# Altium footprint library Connector.PcbLib: 230 footprints (part 6 of 15)
Each footprint in its own frame and in the unit in brackets; x right, y up, seen from the top. Pads: shape width x height; smd on the part's side, far side on the other; paste and mask are expansions set on the pad; w line width, h text height; cw(c..) or ccw(c..) is an arc to the next point about the centre after c.
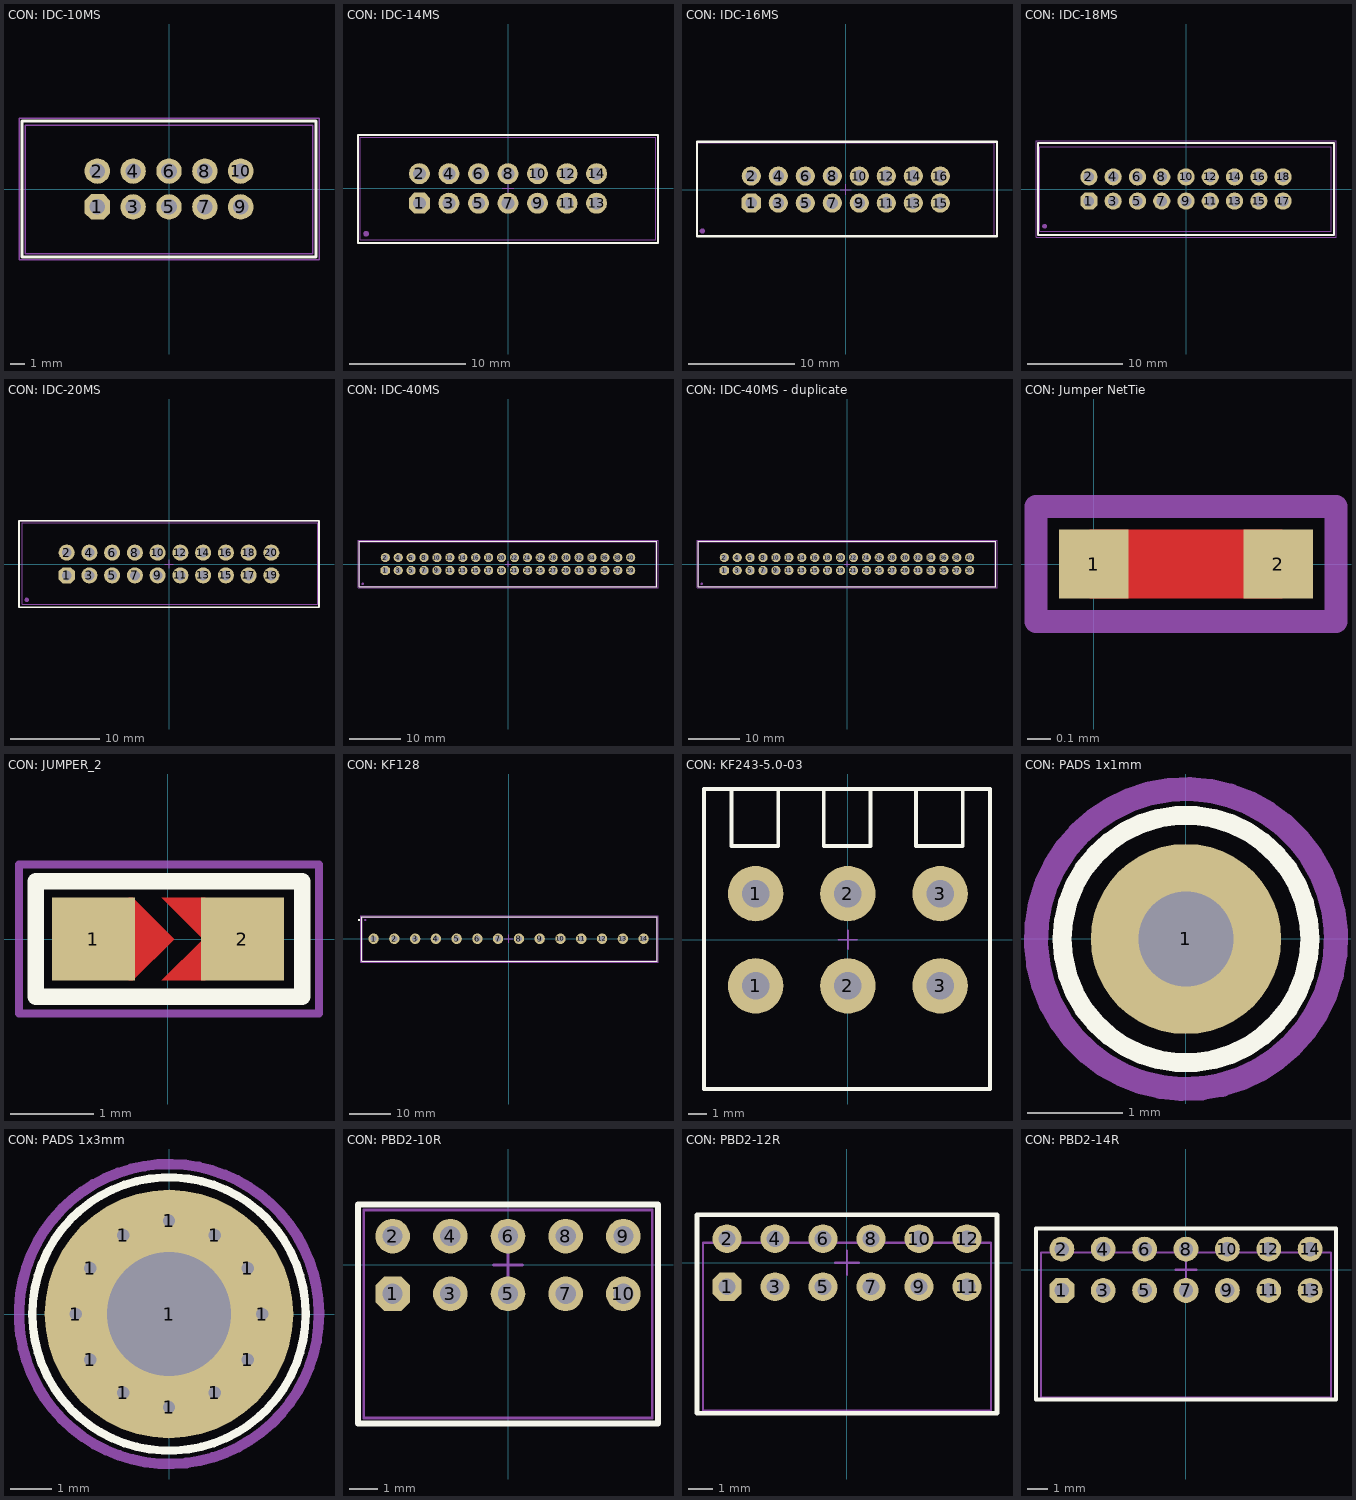
[diagram p5: the footprints below, top view; thin cyan lines are the x and y axes]

## CON: IDC-10MS [mm] "IDC-10MS 10 pin PCB-mount header"
height 10
pads (10):
  oct 1.8x1.8 hole 1.1: 1(-5.08,-1.27)
  round 1.8 hole 1.1: 2(-5.08,1.27) 3(-2.54,-1.27) 4(-2.54,1.27) 5(0,-1.27) 6(0,1.27) 7(2.54,-1.27) 8(2.54,1.27) 9(5.08,-1.27) 10(5.08,1.27)
Top Overlay:
  lines w0.2: -10.414,-4.826 -10.414,4.826 10.414,4.826 10.414,-4.826 -10.414,-4.826
TopAssy:
  lines w0.1: -10.2,-4.6 10.2,-4.6 10.2,4.5 -10.2,4.5 -10.2,-4.6
Border:
  lines w0.1: -10.625,-5.025 10.625,-5.025 10.625,5.025 -10.625,5.025 -10.625,-5.025
3D body "IDC-10MS.STEP": height 9, standoff -3.1, extent -10.14,-4.572 10.16,4.528

## CON: IDC-14MS [mm] "IDC-14MS connector"
height 9
pads (15):
  oct 1.8x1.8 hole 1.1: 1(-7.62,-1.27)
  round 1.8 hole 1.1: 2(-7.62,1.27) 3(-5.08,-1.27) 4(-5.08,1.27) 5(-2.54,-1.27) 6(-2.54,1.27) 7(0,-1.27) 8(0,1.27) 9(2.54,-1.27) 10(2.54,1.27) 11(5.08,-1.27) 12(5.08,1.27) 13(7.62,-1.27) 14(7.62,1.27)
  round 0.5 on Mech1: 38(-12.2,-3.9)
Top Overlay:
  lines w0.2: -12.9,-4.7 12.9,-4.7 12.9,4.6 -12.9,4.6 -12.9,-4.7
TopAssy:
  lines w0.1: -12.7,-4.4 -12.7,4.4 12.7,4.4 12.7,-4.4 -12.7,-4.4
Border:
  lines w0.1: -0.5,0 0.5,0 ; 0,-0.5 0,0.5 ; -12.9,-4.7 -12.9,4.6 12.9,4.6 12.9,-4.7 -12.9,-4.7
3D body "IDC-14MS.STEP": height 9.1, standoff -3, extent -12.24,-4.608 13.19,4.192

## CON: IDC-16MS [mm] "IDC-16MS straight leads pcb mount"
height 9
pads (17):
  oct 1.8x1.8 hole 1.1: 1(-8.89,-1.27)
  round 1.8 hole 1.1: 2(-8.89,1.27) 3(-6.35,-1.27) 4(-6.35,1.27) 5(-3.81,-1.27) 6(-3.81,1.27) 7(-1.27,-1.27) 8(-1.27,1.27) 9(1.27,-1.27) 10(1.27,1.27) 11(3.81,-1.27) 12(3.81,1.27) 13(6.35,-1.27) 14(6.35,1.27) 15(8.89,-1.27) 16(8.89,1.27)
  round 0.5 on Mech1: 39(-13.5,-3.9)
Top Overlay:
  lines w0.2: -14,-4.4 14.224,-4.4 14.224,4.5 -14,4.5 -14,-4.4
TopAssy:
  lines w0.1: -13.985,-4.4 -13.985,4.285 -13.985,4.4 13.985,4.4 13.985,-4.4 -13.985,-4.4
Border:
  lines w0.1: -0.5,0 0.5,0 ; 0,-0.5 0,0.5 ; -14,-4.4 -14,4.5 14.224,4.5 14.224,-4.4 -14,-4.4
3D body "IDC-16MS.STEP": height 9.1, standoff -3, extent -13.985,-4.4 13.985,4.4

## CON: IDC-18MS [mm]
height 10
pads (19):
  oct 1.8x1.8 hole 1.1: 1(-10.16,-1.27)
  round 1.8 hole 1.1: 2(-10.16,1.27) 3(-7.62,-1.27) 4(-7.62,1.27) 5(-5.08,-1.27) 6(-5.08,1.27) 7(-2.54,-1.27) 8(-2.54,1.27) 9(0,-1.27) 10(0,1.27) 11(2.54,-1.27) 12(2.54,1.27) 13(5.08,-1.27) 14(5.08,1.27) 15(7.62,-1.27) 16(7.62,1.27) 17(10.16,-1.27) 18(10.16,1.27)
  round 0.5 on Mech1: 40(-14.8,-3.9)
Top Overlay:
  lines w0.2: -15.494,-4.826 15.494,-4.826 15.494,4.826 -15.494,4.826 -15.494,-4.826
TopAssy:
  lines w0.1: -15.3,-4.4 -15.3,4.4 15.2,4.4 15.2,-4.4 -15.3,-4.4
Border:
  lines w0.1: -15.7,-5.025 -15.7,5.025 15.7,5.025 15.7,-5.025 -15.7,-5.025
3D body "IDC-18MS.STEP": height 10.54, standoff -1, extent -15.28,-4.378 15.23,4.422

## CON: IDC-20MS [mm]
height 10
pads (21):
  oct 1.8x1.8 hole 1.1: 1(-11.43,-1.27)
  round 1.8 hole 1.1: 2(-11.43,1.27) 3(-8.89,-1.27) 4(-8.89,1.27) 5(-6.35,-1.27) 6(-6.35,1.27) 7(-3.81,-1.27) 8(-3.81,1.27) 9(-1.27,-1.27) 10(-1.27,1.27) 11(1.27,-1.27) 12(1.27,1.27) 13(3.81,-1.27) 14(3.81,1.27) 15(6.35,-1.27) 16(6.35,1.27) 17(8.89,-1.27) 18(8.89,1.27) 19(11.43,-1.27) 20(11.43,1.27)
  round 0.5 on Mech1: 41(-15.9,-4)
Top Overlay:
  lines w0.2: -16.764,-4.826 16.764,-4.826 16.764,4.826 -16.764,4.826 -16.764,-4.826
TopAssy:
  lines w0.1: -16.4,-4.5 -16.4,4.6 16.6,4.6 16.6,-4.5 -16.4,-4.5
Border:
  lines w0.1: -0.5,0 0.5,0 ; 0,-0.5 0,0.5 ; -16.764,-4.826 -16.764,4.826 16.764,4.826 16.764,-4.826 -16.764,-4.826
3D body "IDC-20MS.STEP": height 9, standoff -3, extent -16.43,-4.52 16.57,4.58

## CON: IDC-40MS [mm]
height 10
pads (41):
  oct 1.8x1.8 hole 1.1: 1(-24.13,-1.27)
  round 1.8 hole 1.1: 2(-24.13,1.27) 3(-21.59,-1.27) 4(-21.59,1.27) 5(-19.05,-1.27) 6(-19.05,1.27) 7(-16.51,-1.27) 8(-16.51,1.27) 9(-13.97,-1.27) 10(-13.97,1.27) 11(-11.43,-1.27) 12(-11.43,1.27) 13(-8.89,-1.27) 14(-8.89,1.27) 15(-6.35,-1.27) 16(-6.35,1.27) 17(-3.81,-1.27) 18(-3.81,1.27) 19(-1.27,-1.27) 20(-1.27,1.27) 21(1.27,-1.27) 22(1.27,1.27) 23(3.87,-1.27) 24(3.81,1.27) 25(6.35,-1.27) 26(6.35,1.27) 27(8.89,-1.27) 28(8.89,1.27) 29(11.43,-1.27) 30(11.43,1.27) 31(13.97,-1.27) 32(13.97,1.27) 33(16.51,-1.27) 34(16.51,1.27) 35(19.05,-1.27) 36(19.05,1.27) 37(21.59,-1.27) 38(21.59,1.27) 39(24.13,-1.27) 40(24.13,1.27)
  round 0.5 on Mech1: 43(-28.6,-3.9)
Top Overlay:
  lines w0.2: -29.3,-4.5 -29.3,4.5 29.3,4.5 29.3,-4.5 -29.3,-4.5
TopAssy:
  lines w0.1: -29.2,-4.4 29.2,-4.4 29.2,4.4 -29.2,4.4 -29.2,-4.4
Border:
  lines w0.1: -0.5,0 0.5,0 ; 0,-0.5 0,0.5 ; -29.5,-4.7 29.5,-4.7 29.5,4.7 -29.5,4.7 -29.5,-4.7
3D body "IDC-40MS.STEP": height 8.78, standoff -3, extent -29.225,-4.4 29.225,4.4

## CON: IDC-40MS - duplicate [mm]
height 10
pads (41):
  oct 1.8x1.8 hole 1.1: 1(-24.13,-1.27)
  round 1.8 hole 1.1: 2(-24.13,1.27) 3(-21.59,-1.27) 4(-21.59,1.27) 5(-19.05,-1.27) 6(-19.05,1.27) 7(-16.51,-1.27) 8(-16.51,1.27) 9(-13.97,-1.27) 10(-13.97,1.27) 11(-11.43,-1.27) 12(-11.43,1.27) 13(-8.89,-1.27) 14(-8.89,1.27) 15(-6.35,-1.27) 16(-6.35,1.27) 17(-3.81,-1.27) 18(-3.81,1.27) 19(-1.27,-1.27) 20(-1.27,1.27) 21(1.27,-1.27) 22(1.27,1.27) 23(3.87,-1.27) 24(3.81,1.27) 25(6.35,-1.27) 26(6.35,1.27) 27(8.89,-1.27) 28(8.89,1.27) 29(11.43,-1.27) 30(11.43,1.27) 31(13.97,-1.27) 32(13.97,1.27) 33(16.51,-1.27) 34(16.51,1.27) 35(19.05,-1.27) 36(19.05,1.27) 37(21.59,-1.27) 38(21.59,1.27) 39(24.13,-1.27) 40(24.13,1.27)
  round 0.5 on Mech1: 43(-28.6,-3.9)
Top Overlay:
  lines w0.2: -29.3,-4.5 -29.3,4.5 29.3,4.5 29.3,-4.5 -29.3,-4.5
TopAssy:
  lines w0.1: -29.2,-4.4 29.2,-4.4 29.2,4.4 -29.2,4.4 -29.2,-4.4
Border:
  lines w0.1: -0.5,0 0.5,0 ; 0,-0.5 0,0.5 ; -29.5,-4.7 29.5,-4.7 29.5,4.7 -29.5,4.7 -29.5,-4.7
3D body "IDC-40MS.STEP": height 8.78, standoff -3, extent -29.225,-4.4 29.225,4.4

## CON: Jumper NetTie [mm]
pads (2):
  rect 0.3x0.3 smd mask+0.102: 1(0,0) 2(0.8,0)
Top Layer:
  lines w0.3: 0,0 0.8,0
Border:
  lines w0.1: -0.25,-0.25 -0.25,0.25 1.05,0.25 1.05,-0.25 -0.25,-0.25

## CON: JUMPER_2 [mm]
pads (2):
  rect 1x1 smd: 1(-0.9,0) 2(0.9,0)
Top Layer:
  region: -0.475,0.5 -0.425,0.5 0.075,0 -0.425,-0.5 -0.475,-0.5
  region: -0.075,0.5 0.425,0 -0.075,-0.5 0.45,-0.5 0.45,0.5
Top Overlay:
  lines w0.2: -1.6,-0.7 -1.6,0.7 1.625,0.7 1.625,-0.7 -1.6,-0.7
Top Solder:
  region: -1.5,0.6 1.625,0.6 1.625,-0.6 -1.5,-0.6
TopAssy:
  lines w0.1: -1.6,-0.7 1.625,-0.7 1.625,0.7 -1.6,0.7 -1.6,-0.7
Border:
  lines w0.1: -1.8,-0.9 -1.8,0.9 1.825,0.9 1.825,-0.9 -1.8,-0.9

## CON: KF128 [mm]
height 1.5
pads (16):
  round 2.5 hole 1.4: 1(-32.5,0) 2(-27.5,0) 3(-22.5,0) 4(-17.5,0) 5(-12.5,0) 6(-7.5,0) 7(-2.54,0) 8(2.5,0) 9(7.5,0) 10(12.5,0) 11(17.5,0) 12(22.5,0) 13(27.5,0) 14(32.5,0)
  round 0.5 on Mech1: 15(-34.5,4.5)
  round 0.5 on Top Overlay: 16(-36,4.5)
Top Overlay:
  lines w0.2: -35.375,-5.475 -35.375,5.35 35.8,5.35 35.8,-5.475 -35.375,-5.475
TopAssy:
  lines w0.1: -35.22,-5.3 35.68,-5.3 35.68,5.2 -35.22,5.2 -35.22,-5.3
Border:
  lines w0.1: -1,0 1,0 ; 0,-1 0,1 ; -35.55,-5.65 35.975,-5.65 35.975,5.525 -35.55,5.525 -35.55,-5.65
3D body "User Library-TER-KF128-2P.STEP": height 14.45, standoff -4.85, extent 24.92,-5.3 35.68,5.2
3D body "User Library-TER-KF128-3P.STEP": height 14.45, standoff -4.85, extent 9.78,-5.3 25.62,5.2
3D body "User Library-TER-KF128-3P.STEP": height 14.45, standoff -4.85, extent -5.12,-5.3 10.72,5.2
3D body "User Library-TER-KF128-3P.STEP": height 14.45, standoff -4.85, extent -20.02,-5.3 -4.18,5.2
3D body "User Library-TER-KF128-3P.STEP": height 14.45, standoff -4.85, extent -35.22,-5.3 -19.38,5.2

## CON: KF243-5.0-03 [mm]
height 30
pads (6):
  round 3 hole 1.5: 1(-5,-2.5) 1(-5,2.5) 2(0,-2.5) 2(0,2.5) 3(5,-2.5) 3(5,2.5)
Top Overlay:
  lines w0.2: -6.31,8.168 -6.31,5.08 -3.77,5.08 -3.77,8.168 ; -1.31,8.168 -1.31,5.08 1.23,5.08 1.23,8.168 ; 3.69,8.168 3.69,5.08 6.23,5.08 6.23,8.168 ; -7.794,-8.088 -7.794,8.168 7.7,8.168 7.7,-8.088 -7.794,-8.088
TopAssy:
  lines w0.1: -6.31,8.168 -6.31,5.08 -3.77,5.08 -3.77,8.168 ; -1.31,8.168 -1.31,5.08 1.23,5.08 1.23,8.168 ; 3.69,8.168 3.69,5.08 6.23,5.08 6.23,8.168 ; -7.794,-8.088 7.7,-8.088 7.7,8.168 -7.794,8.168 -7.794,-8.088
Border:
  lines w0.1: -0.5,0 0.5,0 ; 0,-0.5 0,0.5 ; -7.794,-8.088 7.7,-8.088 7.7,8.168 -7.794,8.168 -7.794,-8.088
3D body "KF243.STEP": height 19.11, standoff 0, extent -2.5,-7.89 2.5,7.89
3D body "KF243.STEP": height 19.11, standoff 0, extent -7.5,-7.89 -2.5,7.89
3D body "KF243.STEP": height 19.11, standoff 0, extent 2.5,-7.89 7.5,7.89

## CON: PADS 1x1mm [mm]
pads (1):
  round 2 hole 1: 1(0,0)
Top Overlay:
  circle w0.2: c0,0 r1.3
Border:
  lines w0.254: 1.573,0.075 ccw(c0,0) 1.574,0.05

## CON: PADS 1x3mm [mm]
pads (13):
  round 0.7 hole 0.3: 1(-2.25,0) 1(-1.9,-1.1) 1(-1.9,1.1) 1(-1.1,-1.9) 1(-1.1,1.9) 1(0,-2.25) 1(0,2.25) 1(1.1,-1.9) 1(1.1,1.9) 1(1.9,-1.1) 1(1.9,1.1) 1(2.25,0)
  round 6 hole 3: 1(0,0)
Top Overlay:
  circle w0.2: c0,0 r3.3
Border:
  lines w0.254: 3.621,0 cw(c0,0) 3.621,0.025

## CON: PBD2-10R [mm] "PBD-10"
height 10
pads (10):
  oct 1.2x1.2 hole 0.7: 1(-4,-1)
  round 1.2 hole 0.7: 2(-4,1) 3(-2,-1) 4(-2,1) 5(0,-1) 6(0,1) 7(2,-1) 8(2,1) 9(4,1) 10(4,-1)
Top Overlay:
  lines w0.2: -5.2,-5.5 -5.2,2.1 5.2,2.1 5.2,-5.5 -5.2,-5.5
TopAssy:
  lines w0.1: -5,-5.3 5,-5.3 5,1.9 -5,1.9 -5,-5.3
Border:
  lines w0.1: -0.5,0 0.5,0 ; 0,-0.5 0,0.5 ; -5.2,-5.5 -5.2,2.1 5.2,2.1 5.2,-5.5 -5.2,-5.5
3D body "User Library-PBD2-20.STEP": height 4, standoff 0, extent -5,-5.3 5,1.7

## CON: PBD2-12R [mm] "PBD2-12R"
height 10
pads (12):
  oct 1.2x1.2 hole 0.7: 1(-5,-1)
  round 1.2 hole 0.7: 2(-5,1) 3(-3,-1) 4(-3,1) 5(-1,-1) 6(-1,1) 7(1,-1) 8(1,1) 9(3,-1) 10(3,1) 11(5,-1) 12(5,1)
Top Overlay:
  lines w0.2: -6.25,-6.275 6.25,-6.275 6.25,2 -6.25,2 -6.25,-6.275
TopAssy:
  lines w0.1: -6,-6.175 -6,0.825 6,0.825 6,-6.175 -6,-6.175
Border:
  lines w0.1: -0.5,0 0.5,0 ; 0,-0.5 0,0.5 ; -6.25,-6.275 6.25,-6.275 6.25,2 -6.25,2 -6.25,-6.275
3D body "User Library-PBD2-20.STEP": height 4, standoff 0, extent -4,-6.175 6,0.825
3D body "User Library-PBD2-20.STEP": height 4, standoff 0, extent -6,-6.175 4,0.825

## CON: PBD2-14R [mm] "PBD2-14R"
height 10
pads (14):
  oct 1.2x1.2 hole 0.7: 1(-6,-1)
  round 1.2 hole 0.7: 2(-6,1) 3(-4,-1) 4(-4,1) 5(-2,-1) 6(-2,1) 7(0,-1) 8(0,1) 9(2,-1) 10(2,1) 11(4,-1) 12(4,1) 13(6,-1) 14(6,1)
Top Overlay:
  lines w0.2: -7.25,-6.275 7.25,-6.275 7.25,2 -7.25,2 -7.25,-6.275
TopAssy:
  lines w0.1: -7,-6.175 -7,0.825 7,0.825 7,-6.175 -7,-6.175
Border:
  lines w0.1: -0.5,0 0.5,0 ; 0,-0.5 0,0.5 ; -7.25,-6.275 7.25,-6.275 7.25,2 -7.25,2 -7.25,-6.275
3D body "User Library-PBD2-20.STEP": height 4, standoff 0, extent -3,-6.175 7,0.825
3D body "User Library-PBD2-20.STEP": height 4, standoff 0, extent -7,-6.175 3,0.825